# Altium integrated library LEMO Unipole And Multipole Type Connectors.IntLib: 1566 symbols (part 1 of 13) (continued)
## ECC.0B.304.CLV
designator J?
Fixed receptacle with two nuts, with elbow contact for printed circuit (back panel mounting), Key (C), 0B series, Multipole Type with 4 Contacts; Manufacturer: LEMO; PartNumber: ECC.0B.304.CLV; Number of contacts: 4; Contact Diameter: 0.7 mm; AWG: 24; Rated Current(A): 6; DatasheetVersion: Jun-14; PackageReference: ECC.0B.304.CLV; PackageDescription: Fixed receptacle with two nuts, with elbow contact for printed circuit (back panel mounting), Key(C) for Printed Circuit; Supplier 1: Mouser; Supplier Part Number 1: 736-ECC0B304CLV; Supplier 2: Digi-Key; Supplier Part Number 2: ECC.0B.304.CLV-ND; ComponentLink1Description: Manufacturer URL; ComponentLink1URL: http://www.lemo.com; ComponentLink2Description: Datasheet; ComponentLink2URL: http://intra.lemo.ch/catalog/ROW/UK_English/unipole_multipole.pdf
footprint ECC.0B.304.CLV (Socket, Female, Body 9mm dia. Height 18.3 mm, Through hole)
pins: 1, 2, 3, 4

## ECC.0B.305.CLN
designator J?
Fixed receptacle with two nuts and straight contact for printed circuit (back panel mounting), Key (C), 0B series, Multipole Type with 5 Contacts; Manufacturer: LEMO; PartNumber: ECC.0B.305.CLN; Number of contacts: 5; Contact Diameter: 0.7 mm; AWG: 24; Rated Current(A): 6.5; DatasheetVersion: Jun-14; PackageReference: ECC.0B.305.CLN; PackageDescription: Fixed receptacle with two nuts and straight contact for printed circuit (back panel mounting), Key(C) for Printed Circuit; Supplier 1: Mouser; Supplier Part Number 1: N/A; ComponentLink1Description: Manufacturer URL; ComponentLink1URL: http://www.lemo.com; ComponentLink2Description: Datasheet; ComponentLink2URL: http://intra.lemo.ch/catalog/ROW/UK_English/unipole_multipole.pdf
footprint ECC.0B.305.CLN (Socket, Female, Body 9mm dia. Height 16.4 mm, Through hole)
pins: 1, 2, 3, 4, 5

## ECC.0B.305.CLV
designator J?
Fixed receptacle with two nuts, with elbow contact for printed circuit (back panel mounting), Key (C), 0B series, Multipole Type with 5 Contacts; Manufacturer: LEMO; PartNumber: ECC.0B.305.CLV; Number of contacts: 5; Contact Diameter: 0.7 mm; AWG: 24; Rated Current(A): 6; DatasheetVersion: Jun-14; PackageReference: ECC.0B.305.CLV; PackageDescription: Fixed receptacle with two nuts, with elbow contact for printed circuit (back panel mounting), Key(C) for Printed Circuit; Supplier 1: Mouser; Supplier Part Number 1: 736-ECC0B305CLV; Supplier 2: Digi-Key; Supplier Part Number 2: ECC.0B.305.CLV-ND; ComponentLink1Description: Manufacturer URL; ComponentLink1URL: http://www.lemo.com; ComponentLink2Description: Datasheet; ComponentLink2URL: http://intra.lemo.ch/catalog/ROW/UK_English/unipole_multipole.pdf
footprint ECC.0B.305.CLV (Socket, Female, Body 9mm dia. Height 18.3 mm, Through hole)
pins: 1, 2, 3, 4, 5

## ECC.1B.304.CLV
designator J?
Fixed receptacle with two nuts, with elbow contact for printed circuit (back panel mounting), Key (C), 1B series, Multipole Type with 4 Contacts; Manufacturer: LEMO; PartNumber: ECC.1B.304.CLV; Number of contacts: 4; Contact Diameter: 0.9 mm; AWG: 22; Rated Current(A): 6; DatasheetVersion: Jun-14; PackageReference: ECC.1B.304.CLV; PackageDescription: Fixed receptacle with two nuts, with elbow contact for printed circuit (back panel mounting), Key(C) for Printed Circuit; ComponentLink1Description: Manufacturer URL; ComponentLink1URL: http://www.lemo.com; ComponentLink2Description: Datasheet; ComponentLink2URL: http://intra.lemo.ch/catalog/ROW/UK_English/unipole_multipole.pdf
footprint ECC.1B.304.CLV (Socket, Female, Body 12mm dia. Height 20.3 mm, Through hole)
pins: 1, 2, 3, 4

## ECC.1B.305.CLN
designator J?
Fixed receptacle with two nuts and straight contact for printed circuit (back panel mounting), Key (C), 1B series, Multipole Type with 5 Contacts; Manufacturer: LEMO; PartNumber: ECC.1B.305.CLN; Number of contacts: 5; Contact Diameter: 0.9 mm; AWG: 22; Rated Current(A): 9; DatasheetVersion: Jun-14; PackageReference: ECC.1B.305.CLN; PackageDescription: Fixed receptacle with two nuts and straight contact for printed circuit (back panel mounting), Key(C) for Printed Circuit; Supplier 1: Mouser; Supplier Part Number 1: 736-ECC1B305CLN; Supplier 2: Digi-Key; Supplier Part Number 2: ECC.1B.305.CLN-ND; ComponentLink1Description: Manufacturer URL; ComponentLink1URL: http://www.lemo.com; ComponentLink2Description: Datasheet; ComponentLink2URL: http://intra.lemo.ch/catalog/ROW/UK_English/unipole_multipole.pdf
footprint ECC.1B.305.CLN (Socket, Female, Body 12mm dia. Height 19.8 mm, Through hole)
pins: 1, 2, 3, 4, 5

## ECC.1B.308.CLN
designator J?
Fixed receptacle with two nuts and straight contact for printed circuit (back panel mounting), Key (C), 1B series, Multipole Type with 8 Contacts; Manufacturer: LEMO; PartNumber: ECC.1B.308.CLN; Number of contacts: 8; Contact Diameter: 0.7 mm; AWG: 24; Rated Current(A): 5; DatasheetVersion: Jun-14; PackageReference: ECC.1B.308.CLN; PackageDescription: Fixed receptacle with two nuts and straight contact for printed circuit (back panel mounting), Key(C) for Printed Circuit; Supplier 1: Mouser; Supplier Part Number 1: 736-ECC1B308CLN; Supplier 2: Digi-Key; Supplier Part Number 2: ECC.1B.308.CLN-ND; ComponentLink1Description: Manufacturer URL; ComponentLink1URL: http://www.lemo.com; ComponentLink2Description: Datasheet; ComponentLink2URL: http://intra.lemo.ch/catalog/ROW/UK_English/unipole_multipole.pdf
footprint ECC.1B.308.CLN (Socket, Female, Body 12mm dia. Height 19.8 mm, Through hole)
pins: 1, 2, 3, 4, 5, 6, 7, 8

## ECC.1B.308.CLV
designator J?
Fixed receptacle with two nuts, with elbow contact for printed circuit (back panel mounting), Key (C), 1B series, Multipole Type with 8 Contacts; Manufacturer: LEMO; PartNumber: ECC.1B.308.CLV; Number of contacts: 8; Contact Diameter: 0.7 mm; AWG: 24; Rated Current(A): 0; DatasheetVersion: Jun-14; PackageReference: ECC.1B.308.CLV; PackageDescription: Fixed receptacle with two nuts, with elbow contact for printed circuit (back panel mounting), Key(C) for Printed Circuit; ComponentLink1Description: Manufacturer URL; ComponentLink1URL: http://www.lemo.com; ComponentLink2Description: Datasheet; ComponentLink2URL: http://intra.lemo.ch/catalog/ROW/UK_English/unipole_multipole.pdf
footprint ECC.1B.308.CLV (Socket, Female, Body 12mm dia. Height 20.3 mm, Through hole)
pins: 1, 2, 3, 4, 5, 6, 7, 8

## ECC.2B.308.CLV
designator J?
Fixed receptacle with two nuts, with elbow contact for printed circuit (back panel mounting), Key (C), 2B series, Multipole Type with 8 Contacts; Manufacturer: LEMO; PartNumber: ECC.2B.308.CLV; Number of contacts: 8; Contact Diameter: 0.9 mm; AWG: 22; Rated Current(A): 6; DatasheetVersion: Jun-14; PackageReference: ECC.2B.308.CLV; PackageDescription: Fixed receptacle with two nuts, with elbow contact for printed circuit (back panel mounting), Key(C) for Printed Circuit; ComponentLink1Description: Manufacturer URL; ComponentLink1URL: http://www.lemo.com; ComponentLink2Description: Datasheet; ComponentLink2URL: http://intra.lemo.ch/catalog/ROW/UK_English/unipole_multipole.pdf
footprint ECC.2B.308.CLV (Socket, Female, Body 15mm dia. Height 22.3 mm, Through hole)
pins: 1, 2, 3, 4, 5, 6, 7, 8

## ECC.2B.310.CLN
designator J?
Fixed receptacle with two nuts and straight contact for printed circuit (back panel mounting), Key (C), 2B series, Multipole Type with 10 Contacts; Manufacturer: LEMO; PartNumber: ECC.2B.310.CLN; Number of contacts: 10; Contact Diameter: 0.9 mm; AWG: 22; Rated Current(A): 8; DatasheetVersion: Jun-14; PackageReference: ECC.2B.310.CLN; PackageDescription: Fixed receptacle with two nuts and straight contact for printed circuit (back panel mounting), Key(C) for Printed Circuit; ComponentLink1Description: Manufacturer URL; ComponentLink1URL: http://www.lemo.com; ComponentLink2Description: Datasheet; ComponentLink2URL: http://intra.lemo.ch/catalog/ROW/UK_English/unipole_multipole.pdf
footprint ECC.2B.310.CLN (Socket, Female, Body 15mm dia. Height 21.8 mm, Through hole)
pins: 1, 2, 3, 4, 5, 6, 7, 8, 9, 10

## ECC.2B.312.CLN
designator J?
Fixed receptacle with two nuts and straight contact for printed circuit (back panel mounting), Key (C), 2B series, Multipole Type with 12 Contacts; Manufacturer: LEMO; PartNumber: ECC.2B.312.CLN; Number of contacts: 12; Contact Diameter: 0.7 mm; AWG: 24; Rated Current(A): 7; DatasheetVersion: Jun-14; PackageReference: ECC.2B.312.CLN; PackageDescription: Fixed receptacle with two nuts and straight contact for printed circuit (back panel mounting), Key(C) for Printed Circuit; Supplier 1: Mouser; Supplier Part Number 1: 736-ECC2B312CLN; Supplier 2: Digi-Key; Supplier Part Number 2: ECC.2B.312.CLN-ND; ComponentLink1Description: Manufacturer URL; ComponentLink1URL: http://www.lemo.com; ComponentLink2Description: Datasheet; ComponentLink2URL: http://intra.lemo.ch/catalog/ROW/UK_English/unipole_multipole.pdf
footprint ECC.2B.312.CLN (Socket, Female, Body 15mm dia. Height 21.8 mm, Through hole)
pins: 1, 2, 3, 4, 5, 6, 7, 8, 9, 10, 11, 12

## ECC.2B.316.CLN
designator J?
Fixed receptacle with two nuts and straight contact for printed circuit (back panel mounting), Key (C), 2B series, Multipole Type with 16 Contacts; Manufacturer: LEMO; PartNumber: ECC.2B.316.CLN; Number of contacts: 16; Contact Diameter: 0.7 mm; AWG: 24; Rated Current(A): 6; DatasheetVersion: Jun-14; PackageReference: ECC.2B.316.CLN; PackageDescription: Fixed receptacle with two nuts and straight contact for printed circuit (back panel mounting), Key(C) for Printed Circuit; ComponentLink1Description: Manufacturer URL; ComponentLink1URL: http://www.lemo.com; ComponentLink2Description: Datasheet; ComponentLink2URL: http://intra.lemo.ch/catalog/ROW/UK_English/unipole_multipole.pdf
footprint ECC.2B.316.CLN (Socket, Female, Body 15mm dia. Height 21.8 mm, Through hole)
pins: 1, 2, 3, 4, 5, 6, 7, 8, 9, 10, 11, 12, 13, 14, 15, 16

## ECC.2B.319.CLN
designator J?
Fixed receptacle with two nuts and straight contact for printed circuit (back panel mounting), Key (C), 2B series, Multipole Type with 19 Contacts; Manufacturer: LEMO; PartNumber: ECC.2B.319.CLN; Number of contacts: 19; Contact Diameter: 0.7 mm; AWG: 24; Rated Current(A): 5; DatasheetVersion: Jun-14; PackageReference: ECC.2B.319.CLN; PackageDescription: Fixed receptacle with two nuts and straight contact for printed circuit (back panel mounting), Key(C) for Printed Circuit; Supplier 1: Mouser; Supplier Part Number 1: 736-ECC2B319CLN; Supplier 2: Digi-Key; Supplier Part Number 2: ECC.2B.319.CLN-ND; ComponentLink1Description: Manufacturer URL; ComponentLink1URL: http://www.lemo.com; ComponentLink2Description: Datasheet; ComponentLink2URL: http://intra.lemo.ch/catalog/ROW/UK_English/unipole_multipole.pdf
footprint ECC.2B.319.CLN (Socket, Female, Body 15mm dia. Height 21.8 mm, Through hole)
pins: 1, 2, 3, 4, 5, 6, 7, 8, 9, 10, 11, 12, 13, 14, 15, 16, 17, 18, 19

## ECC.3B.324.CLN
designator J?
Fixed receptacle with two nuts and straight contact for printed circuit (back panel mounting), Key (C), 3B series, Multipole Type with 24 Contacts; Manufacturer: LEMO; PartNumber: ECC.3B.324.CLN; Number of contacts: 24; Contact Diameter: 0.7 mm; Rated Current(A): 4; DatasheetVersion: Jun-14; PackageReference: ECC.3B.324.CLN; PackageDescription: Fixed receptacle with two nuts and straight contact for printed circuit (back panel mounting), Key(C) for Printed Circuit; Supplier 1: Mouser; Supplier Part Number 1: 736-ECC3B324CLN; Supplier 2: Digi-Key; Supplier Part Number 2: ECC.3B.324.CLN-ND; AWG: 24; ComponentLink1Description: Manufacturer URL; ComponentLink1URL: http://www.lemo.com; ComponentLink2Description: Datasheet; ComponentLink2URL: http://intra.lemo.ch/catalog/ROW/UK_English/unipole_multipole.pdf
footprint ECC.3B.324.CLN (Socket, Female, Body 18mm dia. Height 25.8 mm, Through hole)
pins: 1, 2, 3, 4, 5, 6, 7, 8, 9, 10, 11, 12, 13, 14, 15, 16, 17, 18, 19, 20, 21, 22, 23, 24

## ECC.4B.324.CLN
designator J?
Fixed receptacle with two nuts and straight contact for printed circuit (back panel mounting), Key (C), 4B series, Multipole Type with 24 Contacts; Manufacturer: LEMO; PartNumber: ECC.4B.324.CLN; Number of contacts: 24; Contact Diameter: 0.9 mm; AWG: 22; Rated Current(A): 7; DatasheetVersion: Jun-14; PackageReference: ECC.4B.324.CLN; PackageDescription: Fixed receptacle with two nuts and straight contact for printed circuit (back panel mounting), Key(C) for Printed Circuit; ComponentLink1Description: Manufacturer URL; ComponentLink1URL: http://www.lemo.com; ComponentLink2Description: Datasheet; ComponentLink2URL: http://intra.lemo.ch/catalog/ROW/UK_English/unipole_multipole.pdf
footprint ECC.4B.324.CLN (Socket, Female, Body 25mm dia. Height 29.8 mm, Through hole)
pins: 1, 2, 3, 4, 5, 6, 7, 8, 9, 10, 11, 12, 13, 14, 15, 16, 17, 18, 19, 20, 21, 22, 23, 24

## ECD.1B.304.CLV
designator J?
Fixed receptacle with two nuts, with elbow contact for printed circuit (back panel mounting), Key (D), 1B series, Multipole Type with 4 Contacts; Manufacturer: LEMO; PartNumber: ECD.1B.304.CLV; Number of contacts: 4; Contact Diameter: 0.9 mm; AWG: 22; Rated Current(A): 6; DatasheetVersion: Jun-14; PackageReference: ECD.1B.304.CLV; PackageDescription: Fixed receptacle with two nuts, with elbow contact for printed circuit (back panel mounting), Key(D) for Printed Circuit; ComponentLink1Description: Manufacturer URL; ComponentLink1URL: http://www.lemo.com; ComponentLink2Description: Datasheet; ComponentLink2URL: http://intra.lemo.ch/catalog/ROW/UK_English/unipole_multipole.pdf
footprint ECD.1B.304.CLV (Socket, Female, Body 12mm dia. Height 20.3 mm, Through hole)
pins: 1, 2, 3, 4

## ECD.1B.308.CLN
designator J?
Fixed receptacle with two nuts and straight contact for printed circuit (back panel mounting), Key (D), 1B series, Multipole Type with 8 Contacts; Manufacturer: LEMO; PartNumber: ECD.1B.308.CLN; Number of contacts: 8; Contact Diameter: 0.7 mm; AWG: 24; Rated Current(A): 5; DatasheetVersion: Jun-14; PackageReference: ECD.1B.308.CLN; PackageDescription: Fixed receptacle with two nuts and straight contact for printed circuit (back panel mounting), Key(D) for Printed Circuit; ComponentLink1Description: Manufacturer URL; ComponentLink1URL: http://www.lemo.com; ComponentLink2Description: Datasheet; ComponentLink2URL: http://intra.lemo.ch/catalog/ROW/UK_English/unipole_multipole.pdf
footprint ECD.1B.308.CLN (Socket, Female, Body 12mm dia. Height 19.8 mm, Through hole)
pins: 1, 2, 3, 4, 5, 6, 7, 8

## ECF.0B.304.CLN
designator J?
Fixed receptacle with two nuts and straight contact for printed circuit (back panel mounting), Key (F), 0B series, Multipole Type with 4 Contacts; Manufacturer: LEMO; PartNumber: ECF.0B.304.CLN; Number of contacts: 4; Contact Diameter: 0.7 mm; AWG: 24; Rated Current(A): 7; DatasheetVersion: Jun-14; PackageReference: ECF.0B.304.CLN; PackageDescription: Fixed receptacle with two nuts and straight contact for printed circuit (back panel mounting), Key(F) for Printed Circuit; ComponentLink1Description: Manufacturer URL; ComponentLink1URL: http://www.lemo.com; ComponentLink2Description: Datasheet; ComponentLink2URL: http://intra.lemo.ch/catalog/ROW/UK_English/unipole_multipole.pdf
footprint ECF.0B.304.CLN (Socket, Female, Body 9mm dia. Height 16.4 mm, Through hole)
pins: 1, 2, 3, 4

## ECF.0B.307.CLV
designator J?
Fixed receptacle with two nuts, with elbow contact for printed circuit (back panel mounting), Key (F), 0B series, Multipole Type with 7 Contacts; Manufacturer: LEMO; PartNumber: ECF.0B.307.CLV; Number of contacts: 7; Contact Diameter: 0.5 mm; AWG: 28; Rated Current(A): 0; DatasheetVersion: Jun-14; PackageReference: ECF.0B.307.CLV; PackageDescription: Fixed receptacle with two nuts, with elbow contact for printed circuit (back panel mounting), Key(F) for Printed Circuit; ComponentLink1Description: Manufacturer URL; ComponentLink1URL: http://www.lemo.com; ComponentLink2Description: Datasheet; ComponentLink2URL: http://intra.lemo.ch/catalog/ROW/UK_English/unipole_multipole.pdf
footprint ECF.0B.307.CLV (Socket, Female, Body 9mm dia. Height 18.3 mm, Through hole)
pins: 1, 2, 3, 4, 5, 6, 7

## ECF.2B.319.CLN
designator J?
Fixed receptacle with two nuts and straight contact for printed circuit (back panel mounting), Key (F), 2B series, Multipole Type with 19 Contacts; Manufacturer: LEMO; PartNumber: ECF.2B.319.CLN; Number of contacts: 19; Contact Diameter: 0.7 mm; AWG: 24; Rated Current(A): 5; DatasheetVersion: Jun-14; PackageReference: ECF.2B.319.CLN; PackageDescription: Fixed receptacle with two nuts and straight contact for printed circuit (back panel mounting), Key(F) for Printed Circuit; Supplier 1: Mouser; Supplier Part Number 1: 736-ECF2B319CLN; Supplier 2: Digi-Key; Supplier Part Number 2: ECF.2B.319.CLN-ND; ComponentLink1Description: Manufacturer URL; ComponentLink1URL: http://www.lemo.com; ComponentLink2Description: Datasheet; ComponentLink2URL: http://intra.lemo.ch/catalog/ROW/UK_English/unipole_multipole.pdf
footprint ECF.2B.319.CLN (Socket, Female, Body 15mm dia. Height 21.8 mm, Through hole)
pins: 1, 2, 3, 4, 5, 6, 7, 8, 9, 10, 11, 12, 13, 14, 15, 16, 17, 18, 19

## ECF.3B.324.CLN
designator J?
Fixed receptacle with two nuts and straight contact for printed circuit (back panel mounting), Key (F), 3B series, Multipole Type with 24 Contacts; Manufacturer: LEMO; PartNumber: ECF.3B.324.CLN; Number of contacts: 24; Contact Diameter: 0.7 mm; Rated Current(A): 4; DatasheetVersion: Jun-14; PackageReference: ECF.3B.324.CLN; PackageDescription: Fixed receptacle with two nuts and straight contact for printed circuit (back panel mounting), Key(F) for Printed Circuit; AWG: 24; ComponentLink1Description: Manufacturer URL; ComponentLink1URL: http://www.lemo.com; ComponentLink2Description: Datasheet; ComponentLink2URL: http://intra.lemo.ch/catalog/ROW/UK_English/unipole_multipole.pdf
footprint ECF.3B.324.CLN (Socket, Female, Body 18mm dia. Height 25.8 mm, Through hole)
pins: 1, 2, 3, 4, 5, 6, 7, 8, 9, 10, 11, 12, 13, 14, 15, 16, 17, 18, 19, 20, 21, 22, 23, 24

## ECG.00.302.CLN
designator J?
Fixed receptacle with two nuts and straight contact for printed circuit (back panel mounting), Key (G), 00 series, Multipole Type with 2 Contacts; Manufacturer: LEMO; PartNumber: ECG.00.302.CLN; Number of contacts: 2; Contact Diameter: 0.5 mm; AWG: 28; Rated Current(A): 5; DatasheetVersion: Jun-14; PackageReference: ECG.00.302.CLN; PackageDescription: Fixed receptacle with two nuts and straight contact for printed circuit (back panel mounting), Key(G) for Printed Circuit; Supplier 1: Mouser; Supplier Part Number 1: N/A; Supplier 2: Newark; Supplier Part Number 2: 80R0499; ComponentLink1Description: Manufacturer URL; ComponentLink1URL: http://www.lemo.com; ComponentLink2Description: Datasheet; ComponentLink2URL: http://intra.lemo.ch/catalog/ROW/UK_English/unipole_multipole.pdf
footprint ECG.00.302.CLN (Socket, Female, Through hole)
pins: 1, 2

## ECG.00.302.CLV
designator J?
Fixed receptacle with two nuts, with elbow contact for printed circuit (back panel mounting), Key (G), 00 series, Multipole Type with 2 Contacts; Manufacturer: LEMO; PartNumber: ECG.00.302.CLV; Number of contacts: 2; Contact Diameter: 0.5 mm; AWG: 28; Rated Current(A): 0; DatasheetVersion: Jun-14; PackageReference: ECG.00.302.CLV; PackageDescription: Fixed receptacle with two nuts, with elbow contact for printed circuit (back panel mounting), Key(G) for Printed Circuit; ComponentLink1Description: Manufacturer URL; ComponentLink1URL: http://www.lemo.com; ComponentLink2Description: Datasheet; ComponentLink2URL: http://intra.lemo.ch/catalog/ROW/UK_English/unipole_multipole.pdf
footprint ECG.00.302.CLV (Socket, Female, Through hole)
pins: 1, 2

## ECG.00.303.CLV
designator J?
Fixed receptacle with two nuts, with elbow contact for printed circuit (back panel mounting), Key (G), 00 series, Multipole Type with 3 Contacts; Manufacturer: LEMO; PartNumber: ECG.00.303.CLV; Number of contacts: 3; Contact Diameter: 0.5 mm; AWG: 28; Rated Current(A): 0; DatasheetVersion: Jun-14; PackageReference: ECG.00.303.CLV; PackageDescription: Fixed receptacle with two nuts, with elbow contact for printed circuit (back panel mounting), Key(G) for Printed Circuit; ComponentLink1Description: Manufacturer URL; ComponentLink1URL: http://www.lemo.com; ComponentLink2Description: Datasheet; ComponentLink2URL: http://intra.lemo.ch/catalog/ROW/UK_English/unipole_multipole.pdf
footprint ECG.00.303.CLV (Socket, Female, Through hole)
pins: 1, 2, 3

## ECG.00.304.CLN
designator J?
Fixed receptacle with two nuts and straight contact for printed circuit (back panel mounting), Key (G), 00 series, Multipole Type with 4 Contacts; Manufacturer: LEMO; PartNumber: ECG.00.304.CLN; Number of contacts: 4; Contact Diameter: 0.5 mm; AWG: 28; Rated Current(A): 2; DatasheetVersion: Jun-14; PackageReference: ECG.00.304.CLN; PackageDescription: Fixed receptacle with two nuts and straight contact for printed circuit (back panel mounting), Key(G) for Printed Circuit; Supplier 1: Mouser; Supplier Part Number 1: 736-ECG00304CLN; Supplier 2: Newark; Supplier Part Number 2: 75R5779; Supplier 3: Digi-Key; Supplier Part Number 3: ECG.00.304.CLN-ND; ComponentLink1Description: Manufacturer URL; ComponentLink1URL: http://www.lemo.com; ComponentLink2Description: Datasheet; ComponentLink2URL: http://intra.lemo.ch/catalog/ROW/UK_English/unipole_multipole.pdf
footprint ECG.00.304.CLN (Socket, Female, Through hole)
pins: 1, 2, 3, 4

## ECG.00.304.CLV
designator J?
Fixed receptacle with two nuts, with elbow contact for printed circuit (back panel mounting), Key (G), 00 series, Multipole Type with 4 Contacts; Manufacturer: LEMO; PartNumber: ECG.00.304.CLV; Number of contacts: 4; Contact Diameter: 0.5 mm; AWG: 28; Rated Current(A): 0; DatasheetVersion: Jun-14; PackageReference: ECG.00.304.CLV; PackageDescription: Fixed receptacle with two nuts, with elbow contact for printed circuit (back panel mounting), Key(G) for Printed Circuit; Supplier 1: Mouser; Supplier Part Number 1: 736-ECG00304CLV; Supplier 2: Digi-Key; Supplier Part Number 2: ECG.00.304.CLV-ND; ComponentLink1Description: Manufacturer URL; ComponentLink1URL: http://www.lemo.com; ComponentLink2Description: Datasheet; ComponentLink2URL: http://intra.lemo.ch/catalog/ROW/UK_English/unipole_multipole.pdf
footprint ECG.00.304.CLV (Socket, Female, Through hole)
pins: 1, 2, 3, 4

## ECG.0B.302.CLN
designator J?
Fixed receptacle with two nuts and straight contact for printed circuit (back panel mounting), Key (G), 0B series, Multipole Type with 2 Contacts; Manufacturer: LEMO; PartNumber: ECG.0B.302.CLN; Number of contacts: 2; Contact Diameter: 0.9 mm; AWG: 22; Rated Current(A): 10; DatasheetVersion: Jun-14; PackageReference: ECG.0B.302.CLN; PackageDescription: Fixed receptacle with two nuts and straight contact for printed circuit (back panel mounting), Key(G) for Printed Circuit; Supplier 1: Mouser; Supplier Part Number 1: 736-ECG0B302CLN; Supplier 2: Newark; Supplier Part Number 2: 57R5189; Supplier 3: Digi-Key; Supplier Part Number 3: ECG.0B.302.CLN-ND; ComponentLink1Description: Manufacturer URL; ComponentLink1URL: http://www.lemo.com; ComponentLink2Description: Datasheet; ComponentLink2URL: http://intra.lemo.ch/catalog/ROW/UK_English/unipole_multipole.pdf
footprint ECG.0B.302.CLN (Socket, Female, Body 9mm dia. Height 16.4 mm, Through hole)
pins: 1, 2

## ECG.0B.302.CLV
designator J?
Fixed receptacle with two nuts, with elbow contact for printed circuit (back panel mounting), Key (G), 0B series, Multipole Type with 2 Contacts; Manufacturer: LEMO; PartNumber: ECG.0B.302.CLV; Number of contacts: 2; Contact Diameter: 0.9 mm; AWG: 22; Rated Current(A): 6; DatasheetVersion: Jun-14; PackageReference: ECG.0B.302.CLV; PackageDescription: Fixed receptacle with two nuts, with elbow contact for printed circuit (back panel mounting), Key(G) for Printed Circuit; Supplier 1: Mouser; Supplier Part Number 1: 736-ECG0B302CLV; Supplier 2: Farnell; Supplier Part Number 2: 9266992; Supplier 3: Digi-Key; Supplier Part Number 3: ECG.0B.302.CLV-ND; ComponentLink1Description: Manufacturer URL; ComponentLink1URL: http://www.lemo.com; ComponentLink2Description: Datasheet; ComponentLink2URL: http://intra.lemo.ch/catalog/ROW/UK_English/unipole_multipole.pdf
footprint ECG.0B.302.CLV (Socket, Female, Body 9mm dia. Height 18.3 mm, Through hole)
pins: 1, 2

## ECG.0B.303.CLN
designator J?
Fixed receptacle with two nuts and straight contact for printed circuit (back panel mounting), Key (G), 0B series, Multipole Type with 3 Contacts; Manufacturer: LEMO; PartNumber: ECG.0B.303.CLN; Number of contacts: 3; Contact Diameter: 0.9 mm; AWG: 22; Rated Current(A): 8; DatasheetVersion: Jun-14; PackageReference: ECG.0B.303.CLN; PackageDescription: Fixed receptacle with two nuts and straight contact for printed circuit (back panel mounting), Key(G) for Printed Circuit; Supplier 1: Mouser; Supplier Part Number 1: 736-ECG0B303CLN; Supplier 2: Newark; Supplier Part Number 2: 68R6316; Supplier 3: Digi-Key; Supplier Part Number 3: ECG.0B.303.CLN-ND; ComponentLink1Description: Manufacturer URL; ComponentLink1URL: http://www.lemo.com; ComponentLink2Description: Datasheet; ComponentLink2URL: http://intra.lemo.ch/catalog/ROW/UK_English/unipole_multipole.pdf
footprint ECG.0B.303.CLN (Socket, Female, Body 9mm dia. Height 16.4 mm, Through hole)
pins: 1, 2, 3

## ECG.0B.303.CLV
designator J?
Fixed receptacle with two nuts, with elbow contact for printed circuit (back panel mounting), Key (G), 0B series, Multipole Type with 3 Contacts; Manufacturer: LEMO; PartNumber: ECG.0B.303.CLV; Number of contacts: 3; Contact Diameter: 0.9 mm; AWG: 22; Rated Current(A): 6; DatasheetVersion: Jun-14; PackageReference: ECG.0B.303.CLV; PackageDescription: Fixed receptacle with two nuts, with elbow contact for printed circuit (back panel mounting), Key(G) for Printed Circuit; Supplier 1: Mouser; Supplier Part Number 1: 736-ECG0B303CLV; Supplier 2: Farnell; Supplier Part Number 2: 9267000; Supplier 3: Digi-Key; Supplier Part Number 3: ECG.0B.303.CLV-ND; ComponentLink1Description: Manufacturer URL; ComponentLink1URL: http://www.lemo.com; ComponentLink2Description: Datasheet; ComponentLink2URL: http://intra.lemo.ch/catalog/ROW/UK_English/unipole_multipole.pdf
footprint ECG.0B.303.CLV (Socket, Female, Body 9mm dia. Height 18.3 mm, Through hole)
pins: 1, 2, 3

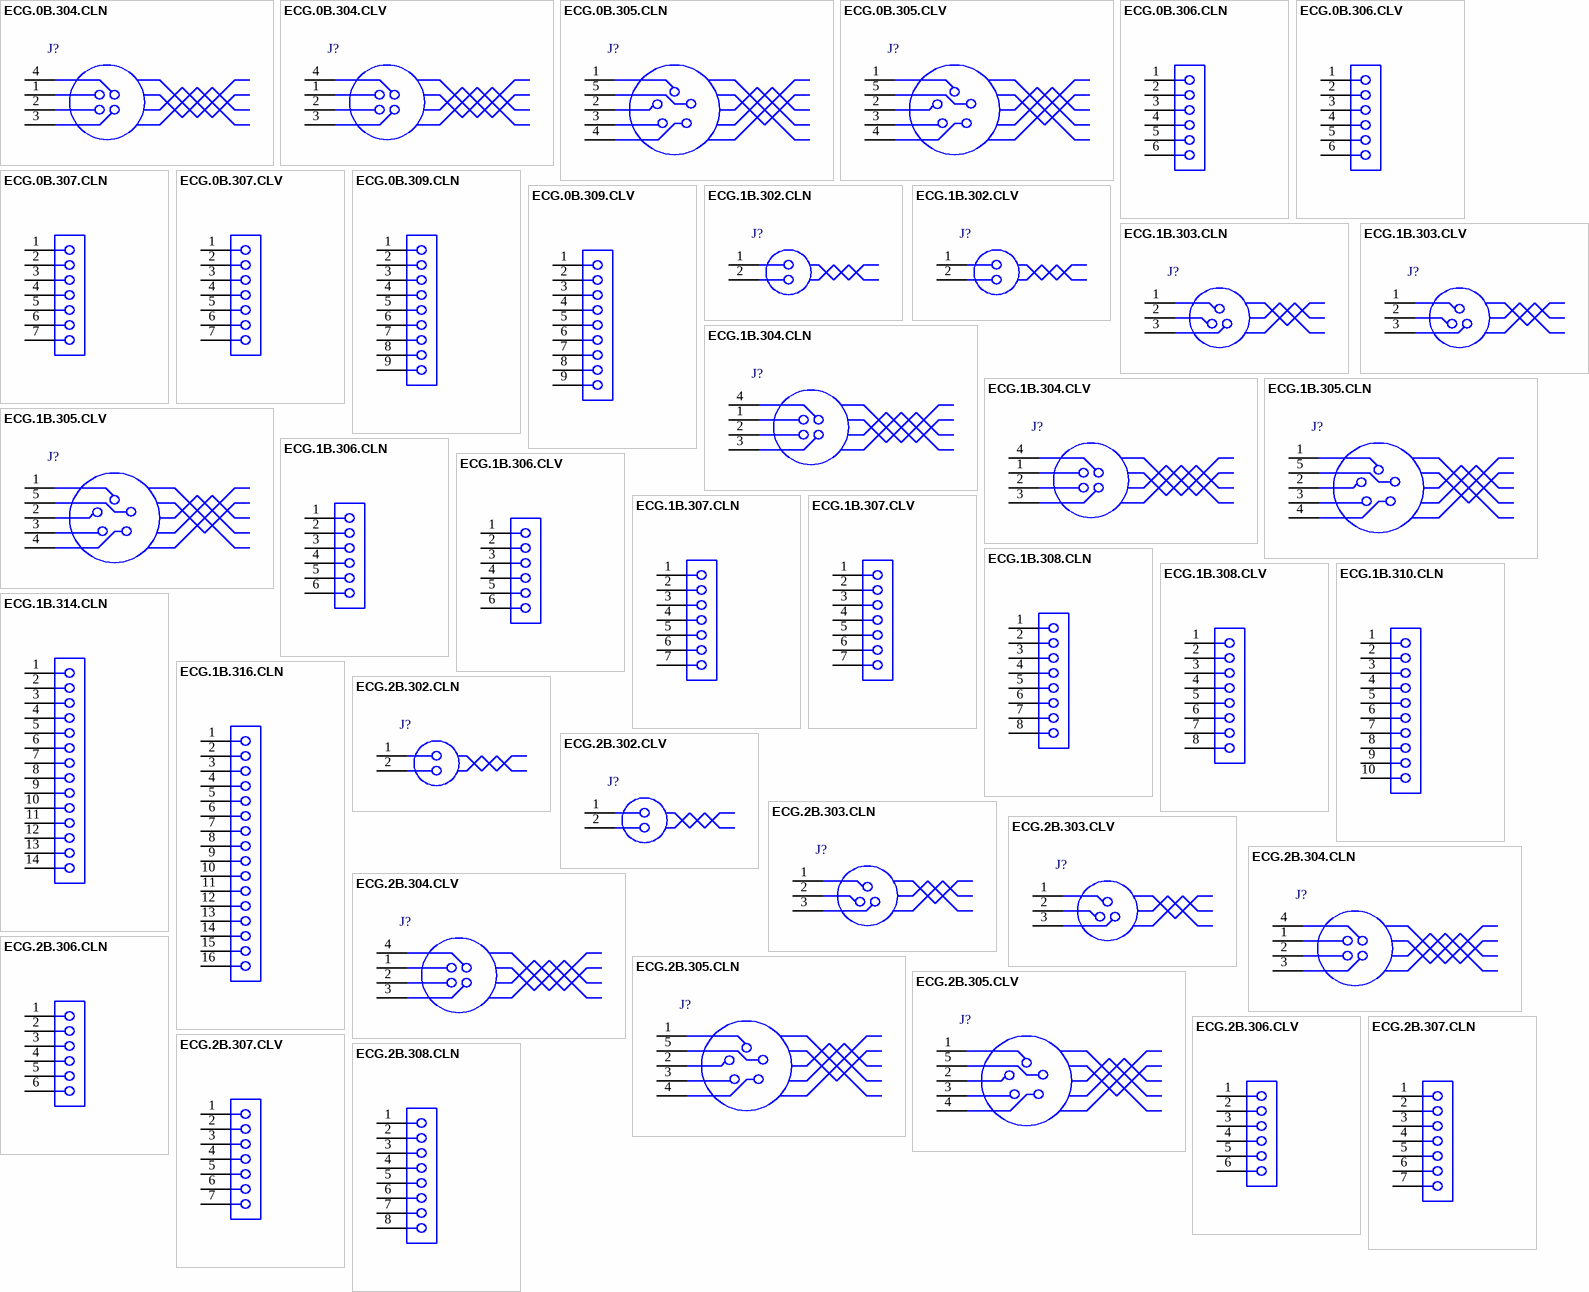
[diagram p2: symbols ECG.0B.304.CLN to ECG.2B.308.CLN]

## ECG.0B.304.CLN
designator J?
Fixed receptacle with two nuts and straight contact for printed circuit (back panel mounting), Key (G), 0B series, Multipole Type with 4 Contacts; Manufacturer: LEMO; PartNumber: ECG.0B.304.CLN; Number of contacts: 4; Contact Diameter: 0.7 mm; AWG: 24; Rated Current(A): 7; DatasheetVersion: Jun-14; PackageReference: ECG.0B.304.CLN; PackageDescription: Fixed receptacle with two nuts and straight contact for printed circuit (back panel mounting), Key(G) for Printed Circuit; Supplier 1: Mouser; Supplier Part Number 1: 736-ECG0B304CLN; Supplier 2: Newark; Supplier Part Number 2: 12R0297; Supplier 3: Digi-Key; Supplier Part Number 3: 1124-1318-ND; ComponentLink1Description: Manufacturer URL; ComponentLink1URL: http://www.lemo.com; ComponentLink2Description: Datasheet; ComponentLink2URL: http://intra.lemo.ch/catalog/ROW/UK_English/unipole_multipole.pdf
footprint ECG.0B.304.CLN (Socket, Female, Body 9mm dia. Height 16.4 mm, Through hole)
pins: 1, 2, 3, 4

## ECG.0B.304.CLV
designator J?
Fixed receptacle with two nuts, with elbow contact for printed circuit (back panel mounting), Key (G), 0B series, Multipole Type with 4 Contacts; Manufacturer: LEMO; PartNumber: ECG.0B.304.CLV; Number of contacts: 4; Contact Diameter: 0.7 mm; AWG: 24; Rated Current(A): 6; DatasheetVersion: Jun-14; PackageReference: ECG.0B.304.CLV; PackageDescription: Fixed receptacle with two nuts, with elbow contact for printed circuit (back panel mounting), Key(G) for Printed Circuit; Supplier 1: Mouser; Supplier Part Number 1: 736-ECG0B304CLV; Supplier 2: Farnell; Supplier Part Number 2: 9267018; Supplier 3: Digi-Key; Supplier Part Number 3: 1124-1319-ND; ComponentLink1Description: Manufacturer URL; ComponentLink1URL: http://www.lemo.com; ComponentLink2Description: Datasheet; ComponentLink2URL: http://intra.lemo.ch/catalog/ROW/UK_English/unipole_multipole.pdf
footprint ECG.0B.304.CLV (Socket, Female, Body 9mm dia. Height 18.3 mm, Through hole)
pins: 1, 2, 3, 4

## ECG.0B.305.CLN
designator J?
Fixed receptacle with two nuts and straight contact for printed circuit (back panel mounting), Key (G), 0B series, Multipole Type with 5 Contacts; Manufacturer: LEMO; PartNumber: ECG.0B.305.CLN; Number of contacts: 5; Contact Diameter: 0.7 mm; AWG: 24; Rated Current(A): 6.5; DatasheetVersion: Jun-14; PackageReference: ECG.0B.305.CLN; PackageDescription: Fixed receptacle with two nuts and straight contact for printed circuit (back panel mounting), Key(G) for Printed Circuit; Supplier 1: Mouser; Supplier Part Number 1: 736-ECG0B305CLN; Supplier 2: Newark; Supplier Part Number 2: 57R5190; Supplier 3: Digi-Key; Supplier Part Number 3: 1124-1320-ND; ComponentLink1Description: Manufacturer URL; ComponentLink1URL: http://www.lemo.com; ComponentLink2Description: Datasheet; ComponentLink2URL: http://intra.lemo.ch/catalog/ROW/UK_English/unipole_multipole.pdf
footprint ECG.0B.305.CLN (Socket, Female, Body 9mm dia. Height 16.4 mm, Through hole)
pins: 1, 2, 3, 4, 5
